# Altium footprint library PCB_TechDemo.PcbLib: 44 footprints (part 2 of 3)
Each footprint in its own frame and in the unit in brackets; x right, y up, seen from the top. Pads: shape width x height; smd on the part's side, far side on the other; paste and mask are expansions set on the pad; w line width, h text height; cw(c..) or ccw(c..) is an arc to the next point about the centre after c.
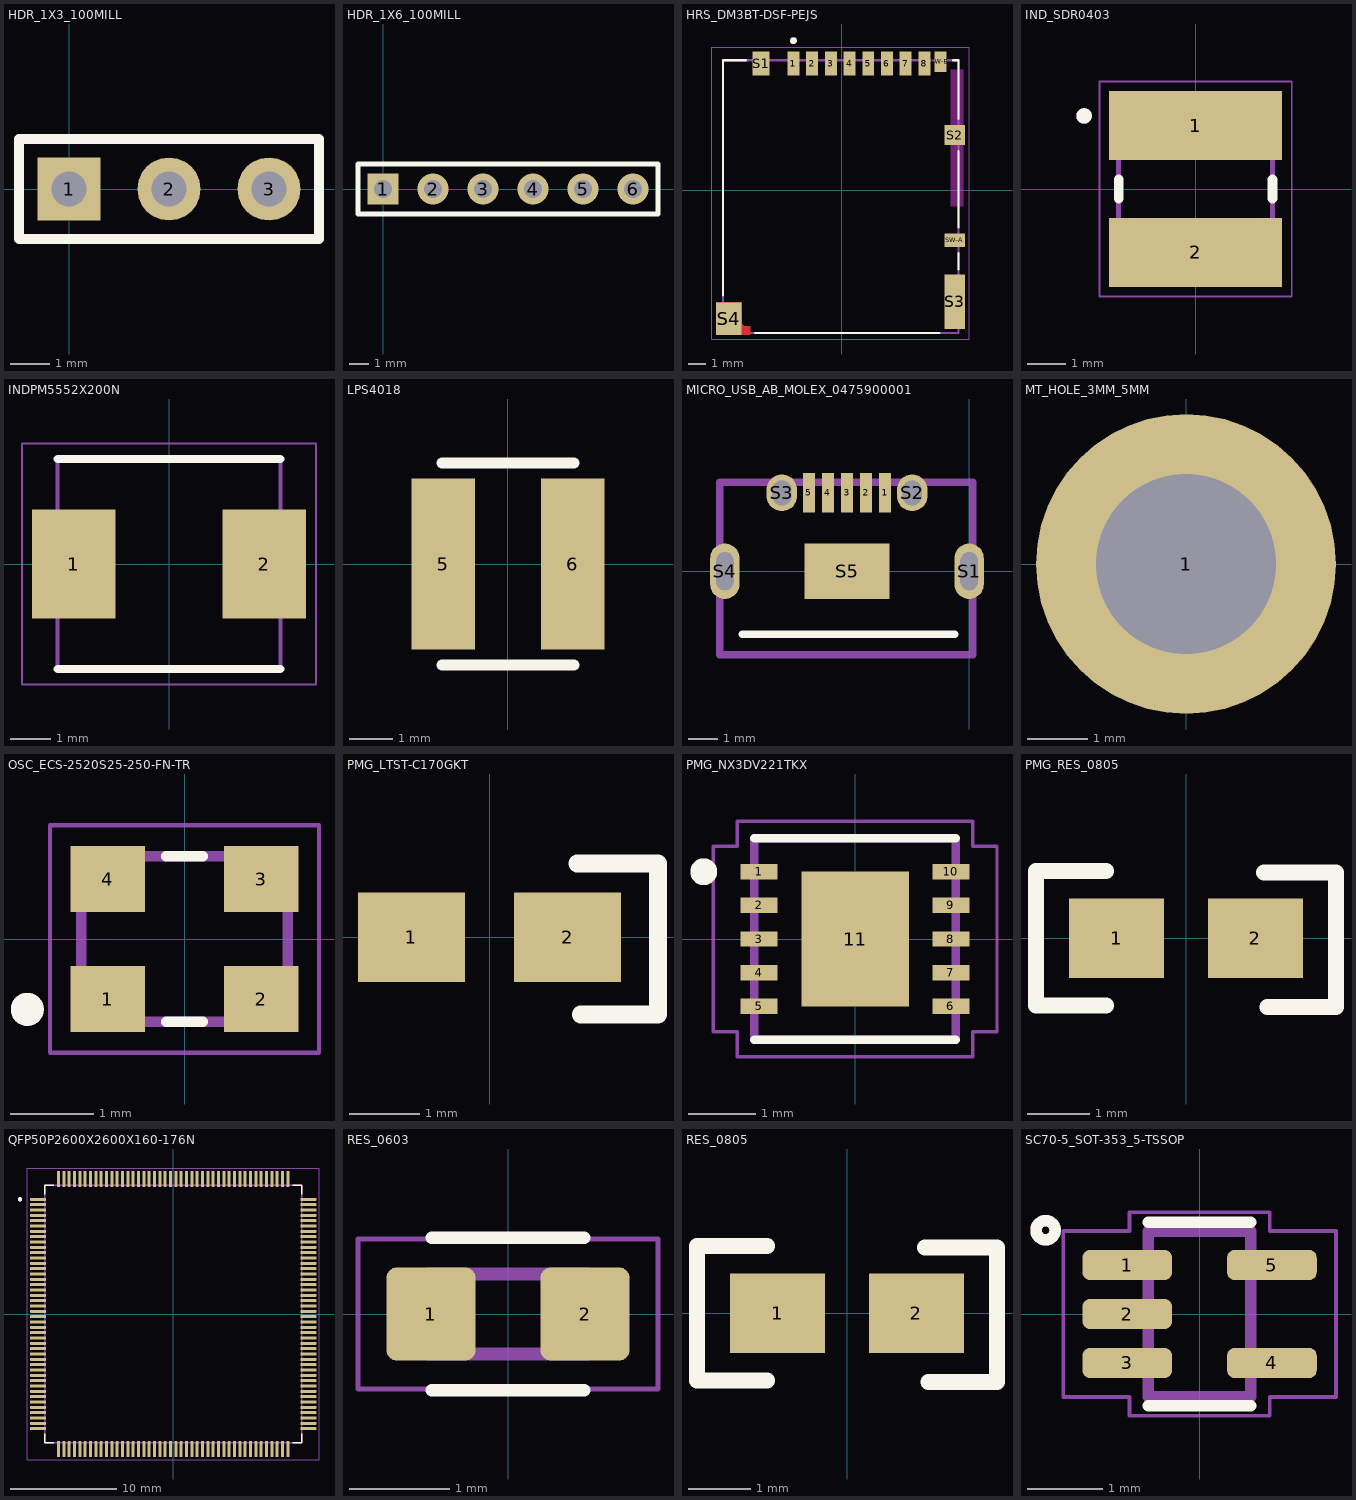
[diagram p1: the footprints below, top view; thin cyan lines are the x and y axes]

## HDR_1X3_100MILL [mm] "SINGLE ROW 3 PIN HDR 2.54MM"
height 10.16
pads (3):
  rect 1.6x1.6 hole 0.9: 1(0,0)
  round 1.6 hole 0.9: 2(2.54,0) 3(5.08,0)
Top Overlay:
  lines w0.254: -1.27,-1.27 6.35,-1.27 6.35,1.27 -1.27,1.27 -1.27,-1.27
3D body: height 8.57, standoff -2.97, extent -1.27,-1.27 6.35,1.27

## HDR_1X6_100MILL [mm] "SINGLE ROW 6 PIN HDR 2.54MM"
pads (6):
  rect 1.6x1.6 hole 0.9: 1(0,0)
  round 1.6 hole 0.9: 2(2.54,0) 3(5.08,0) 4(7.62,0) 5(10.16,0) 6(12.7,0)
Top Overlay:
  lines w0.254: -1.27,-1.27 13.97,-1.27 13.97,1.27 -1.27,1.27 -1.27,-1.27
3D body: height 8.57, standoff -2.97, extent -1.32,-1.17 13.92,1.37

## HRS_DM3BT-DSF-PEJS [mm] "HIROSE_DM3BT-DSF-PEJS"
height 3
pads (14):
  rect 0.7x1.4 smd: 1(-2.85,7.45) 2(-1.75,7.45) 3(-0.65,7.45) 4(0.45,7.45) 5(1.55,7.45) 6(2.65,7.45) 7(3.75,7.45) 8(4.85,7.45)
  rect 1x1.4 smd: S1(-4.75,7.45)
  rect 1.2x1.2 smd: S2(6.65,3.25)
  rect 1.2x3.2 smd: S3(6.65,-6.55)
  rect 1.5x1.9 smd paste-2 mask+0: S4(-6.65,-7.55)
  rect 1.2x0.8 smd: SW-A(6.65,-2.95)
  rect 0.7x1.2 smd: SW-B(5.8,7.55)
Top Layer:
  region: -5.9,-7.85 -5.75,-8 -5.4,-8 -5.4,-8.5 -7.4,-8.5 -7.4,-6.6 -5.9,-6.6
Top Overlay:
  circle w0.2: c-2.85,8.8 r0.1
  lines w0.127: -7,-6.2 -7,7.65 -5.65,7.65 ; -5.1,-8.4 5.75,-8.4 ; 6.55,7.65 6.85,7.65 6.85,4.2 ; 6.85,-4.65 6.85,-3.7 ; 6.85,-2.2 6.85,2.3
Top Paste:
  region: -5.9,-7.85 -5.75,-8 -5.4,-8 -5.4,-8.5 -7.4,-8.5 -7.4,-6.6 -5.9,-6.6
Top Solder:
  region: -5.8,-7.75 -5.65,-7.9 -5.3,-7.9 -5.3,-8.6 -7.5,-8.6 -7.5,-6.5 -5.8,-6.5
Keep-Out Layer:
  region: 7.15,-0.95 6.4,-0.95 6.4,2.65 7.15,2.65
  region: 7.15,3.85 6.4,3.85 6.4,7.1 7.15,7.1
  region: 7.15,-0.95 6.4,-0.95 6.4,2.65 7.15,2.65
  region: 7.15,3.85 6.4,3.85 6.4,7.1 7.15,7.1
Mechanical 13:
  circle w0.2: c-2.85,8.8 r0.1
  lines w0.127: -7,-8.4 -7,7.65 6.85,7.65 6.85,-8.4 -7,-8.4
Mechanical 15:
  lines w0.05: -7.65,-8.75 -7.65,8.4 7.5,8.4 7.5,-8.75 -7.65,-8.75
3D body: height 1.85, standoff 0.02, extent -7,-9.875 6.85,7.675

## IND_SDR0403 [mm] "INDUCTOR BOURNS SDR0403 SERIES"
height 3.5
pads (2):
  rect 4.5x1.8 smd: 1(0,1.65) 2(0,-1.65)
Top Overlay:
  circle w0.2: c-2.9,1.9 r0.1
  lines w0.254: -2,-0.25 -2,0.25 ; 2,-0.25 2,0.25
Mechanical 13:
  circle w0.2: c-2.9,1.9 r0.1
  lines w0.127: -2,-0.75 ccw(c0,-0.361) 2,-0.75 2,0.75 ccw(c0,0.361) -2,0.75 -2,-0.75
Mechanical 15:
  lines w0.05: -2.5,-2.8 -2.5,2.8 2.5,2.8 2.5,-2.8 -2.5,-2.8
3D body: height 3.25, standoff 0, extent -2.25,-2.201 2.25,2.201

## INDPM5552X200N [mm] "VISHAY IHLP-2020BZ-01"
height 2
pads (2):
  rect 2.05x2.7 smd: 1(-2.35,0) 2(2.35,0)
Top Overlay:
  lines w0.2: -2.745,-2.59 2.745,-2.59 ; -2.745,2.59 2.745,2.59
Mechanical 13:
  lines w0.05: -3.625,-2.967 -3.625,2.967 3.625,2.967 3.625,-2.967 -3.625,-2.967
  lines w0.1: -2.745,-2.59 -2.745,2.59 2.745,2.59 2.745,-2.59 -2.745,-2.59
3D body: height 2.05, standoff 0.13, extent -2.725,-2.546 2.725,2.6

## LPS4018 [mm] "COIL CRAFT LPS4018 INDUCTOR SERIES"
height 1.8
pads (2):
  rect 1.45x3.89 smd: 5(-1.475,0) 6(1.475,0)
Top Overlay:
  lines w0.254: -1.5,-2.3 1.5,-2.3 ; -1.5,2.3 1.5,2.3
3D body: height 1.8, standoff 0, extent -1.99,-1.99 1.99,1.99

## MICRO_USB_AB_MOLEX_0475900001 [mm] "MICRO USB AB MOLEX 0475900001"
height 0.6
pads (10):
  rect 0.4x1.35 smd: 1(-2.875,2.675) 2(-3.525,2.675) 3(-4.175,2.675) 4(-4.825,2.675) 5(-5.475,2.675)
  oval 1x1.9 hole 0.6 slot 1.3 at 90 deg: S1(0,0) S4(-8.35,0)
  oval 1.05x1.25 hole 0.65 slot 0.85 at 90 deg: S2(-1.95,2.675) S3(-6.4,2.675)
  rect 2.9x1.9 smd: S5(-4.175,0)
Top Overlay:
  lines w0.254: -7.75,-2.15 -0.5,-2.15
Mechanical 15:
  lines w0.254: -8.525,-2.859 0.125,-2.859 0.125,3.034 -8.525,3.034 -8.525,-2.859
3D body: height 2.76, standoff -0.55, extent -8.5,-2.947 0.15,2.947

## MT_HOLE_3MM_5MM [mm] "3MM ID / 5MM OD"
pads (1):
  round 5 hole 3: 1(0,0)

## OSC_ECS-2520S25-250-FN-TR [mm]
pads (4):
  rect 0.9x0.8 smd: 1(-0.925,-0.725) 2(0.925,-0.725) 3(0.925,0.725) 4(-0.925,0.725)
Top Overlay:
  circle w0.2: c-1.9,-0.85 r0.1
  lines w0.127: -0.221,-1 0.221,-1 ; -0.221,1 0.221,1
Mechanical 13:
  circle w0.2: c-1.9,-0.85 r0.1
  lines w0.127: -1.25,-1 -1.25,1 1.25,1 1.25,-1 -1.25,-1
Mechanical 15:
  lines w0.05: -1.625,-1.375 -1.625,1.375 1.625,1.375 1.625,-1.375 -1.625,-1.375
3D body: height 0.82, standoff 0, extent -1.6,-1.25 1.6,1.25

## PMG_LTST-C170GKT [mil] "LTST-C170GKT"
height 43.31
pads (2):
  rect 60x50 smd: 1(-43.78,0) 2(43.78,0)
Top Overlay:
  lines w10: 49.21,41.34 94.49,41.34 94.49,-43.31 51.18,-43.31
3D body: height 43.31, standoff -0.39, extent -39.37,-24.6 39.37,24.61

## PMG_NX3DV221TKX [mm] "SWDAT_IC USB 2.0 SWITCH HS 10HVSON"
pads (11):
  rect 0.55x0.23 smd: 1(-1.425,1) 2(-1.425,0.5) 3(-1.425,0) 4(-1.425,-0.5) 5(-1.425,-1) 6(1.425,-1) 7(1.425,-0.5) 8(1.425,0) 9(1.425,0.5) 10(1.425,1)
  rect 1.6x2 smd paste-2: 11(0,0)
Top Overlay:
  circle w0.2: c-2.25,1 r0.1
  lines w0.127: -1.5,-1.5 1.5,-1.5 ; -1.5,1.5 1.5,1.5
Top Paste:
  region: 0.506,-0.635 -0.506,-0.635 -0.506,0.634 0.506,0.634
Mechanical 13:
  lines w0.127: -1.5,-1.5 -1.5,1.5 1.5,1.5 1.5,-1.5 -1.5,-1.5
Mechanical 15:
  lines w0.05: -2.11,-1.38 -2.11,1.38 -1.75,1.38 -1.75,1.75 1.75,1.75 1.75,1.38 2.11,1.38 2.11,-1.38 1.75,-1.38 1.75,-1.75 -1.75,-1.75 -1.75,-1.38 -2.11,-1.38
3D body: height 1, standoff 0, extent -1.5,-1.5 1.5,1.5

## PMG_RES_0805 [mil] "RES 0805"
pads (2):
  rect 60x50 smd: 1(-43.78,0) 2(43.78,0)
Top Overlay:
  lines w10: -50.2,-42.32 -94.49,-42.32 ; -50.2,42.32 -94.49,42.32 ; 49.21,41.34 94.49,41.34 94.49,-43.31 51.18,-43.31 ; -94.49,-42.32 -94.49,-42.32 ; -94.49,-42.32 -94.49,42.32 ; -94.49,42.32 -94.49,42.32
3D body: height 29.92, standoff 0, extent -45.27,-26.57 45.28,26.58
3D body: height 43.31, standoff 0, extent -39.37,118.11 -39.37,118.11

## QFP50P2600X2600X160-176N [mm]
pads (176):
  rrect25% 1.49x0.28 smd: 1(-12.67,10.75) 2(-12.67,10.25) 3(-12.67,9.75) 4(-12.67,9.25) 5(-12.67,8.75) 6(-12.67,8.25) 7(-12.67,7.75) 8(-12.67,7.25) 9(-12.67,6.75) 10(-12.67,6.25) 11(-12.67,5.75) 12(-12.67,5.25) 13(-12.67,4.75) 14(-12.67,4.25) 15(-12.67,3.75) 16(-12.67,3.25) 17(-12.67,2.75) 18(-12.67,2.25) 19(-12.67,1.75) 20(-12.67,1.25) 21(-12.67,0.75) 22(-12.67,0.25) 23(-12.67,-0.25) 24(-12.67,-0.75) 25(-12.67,-1.25) 26(-12.67,-1.75) 27(-12.67,-2.25) 28(-12.67,-2.75) 29(-12.67,-3.25) 30(-12.67,-3.75) 31(-12.67,-4.25) 32(-12.67,-4.75) 33(-12.67,-5.25) 34(-12.67,-5.75) 35(-12.67,-6.25) 36(-12.67,-6.75) 37(-12.67,-7.25) 38(-12.67,-7.75) 39(-12.67,-8.25) 40(-12.67,-8.75) 41(-12.67,-9.25) 42(-12.67,-9.75) 43(-12.67,-10.25) 44(-12.67,-10.75) 89(12.67,-10.75) 90(12.67,-10.25) 91(12.67,-9.75) 92(12.67,-9.25) 93(12.67,-8.75) 94(12.67,-8.25) 95(12.67,-7.75) 96(12.67,-7.25) 97(12.67,-6.75) 98(12.67,-6.25) 99(12.67,-5.75) 100(12.67,-5.25) 101(12.67,-4.75) 102(12.67,-4.25) 103(12.67,-3.75) 104(12.67,-3.25) 105(12.67,-2.75) 106(12.67,-2.25) 107(12.67,-1.75) 108(12.67,-1.25) 109(12.67,-0.75) 110(12.67,-0.25) 111(12.67,0.25) 112(12.67,0.75) 113(12.67,1.25) 114(12.67,1.75) 115(12.67,2.25) 116(12.67,2.75) 117(12.67,3.25) 118(12.67,3.75) 119(12.67,4.25) 120(12.67,4.75) 121(12.67,5.25) 122(12.67,5.75) 123(12.67,6.25) 124(12.67,6.75) 125(12.67,7.25) 126(12.67,7.75) 127(12.67,8.25) 128(12.67,8.75) 129(12.67,9.25) 130(12.67,9.75) 131(12.67,10.25) 132(12.67,10.75)
  rrect25% 0.28x1.49 smd: 45(-10.75,-12.67) 46(-10.25,-12.67) 47(-9.75,-12.67) 48(-9.25,-12.67) 49(-8.75,-12.67) 50(-8.25,-12.67) 51(-7.75,-12.67) 52(-7.25,-12.67) 53(-6.75,-12.67) 54(-6.25,-12.67) 55(-5.75,-12.67) 56(-5.25,-12.67) 57(-4.75,-12.67) 58(-4.25,-12.67) 59(-3.75,-12.67) 60(-3.25,-12.67) 61(-2.75,-12.67) 62(-2.25,-12.67) 63(-1.75,-12.67) 64(-1.25,-12.67) 65(-0.75,-12.67) 66(-0.25,-12.67) 67(0.25,-12.67) 68(0.75,-12.67) 69(1.25,-12.67) 70(1.75,-12.67) 71(2.25,-12.67) 72(2.75,-12.67) 73(3.25,-12.67) 74(3.75,-12.67) 75(4.25,-12.67) 76(4.75,-12.67) 77(5.25,-12.67) 78(5.75,-12.67) 79(6.25,-12.67) 80(6.75,-12.67) 81(7.25,-12.67) 82(7.75,-12.67) 83(8.25,-12.67) 84(8.75,-12.67) 85(9.25,-12.67) 86(9.75,-12.67) 87(10.25,-12.67) 88(10.75,-12.67) 133(10.75,12.67) 134(10.25,12.67) 135(9.75,12.67) 136(9.25,12.67) 137(8.75,12.67) 138(8.25,12.67) 139(7.75,12.67) 140(7.25,12.67) 141(6.75,12.67) 142(6.25,12.67) 143(5.75,12.67) 144(5.25,12.67) 145(4.75,12.67) 146(4.25,12.67) 147(3.75,12.67) 148(3.25,12.67) 149(2.75,12.67) 150(2.25,12.67) 151(1.75,12.67) 152(1.25,12.67) 153(0.75,12.67) 154(0.25,12.67) 155(-0.25,12.67) 156(-0.75,12.67) 157(-1.25,12.67) 158(-1.75,12.67) 159(-2.25,12.67) 160(-2.75,12.67) 161(-3.25,12.67) 162(-3.75,12.67) 163(-4.25,12.67) 164(-4.75,12.67) 165(-5.25,12.67) 166(-5.75,12.67) 167(-6.25,12.67) 168(-6.75,12.67) 169(-7.25,12.67) 170(-7.75,12.67) 171(-8.25,12.67) 172(-8.75,12.67) 173(-9.25,12.67) 174(-9.75,12.67) 175(-10.25,12.67) 176(-10.75,12.67)
Top Overlay:
  circle w0.2: c-14.36,10.75 r0.1
  lines w0.127: -12.05,-11.21 -12.05,-12.05 -11.21,-12.05 ; -12.05,11.21 -12.05,12.05 -11.21,12.05 ; 11.21,-12.05 12.05,-12.05 12.05,-11.21 ; 11.21,12.05 12.05,12.05 12.05,11.21
Mechanical 13:
  circle w0.2: c-14.36,10.75 r0.1
  lines w0.127: -12.05,-12.05 -12.05,12.05 12.05,12.05 12.05,-12.05 -12.05,-12.05
Mechanical 15:
  lines w0.05: -13.665,-13.665 -13.665,13.665 13.665,13.665 13.665,-13.665 -13.665,-13.665
3D body: height 1.55, standoff -0.02, extent -12.886,-12.886 12.886,12.886

## RES_0603 [mm] "RES 0603 .125W"
height 0.9
pads (2):
  rrect22% 0.89x0.93 smd: 1(-0.77,0) 2(0.77,0)
Top Overlay:
  lines w0.127: -0.762,-0.762 0.762,-0.762 ; -0.762,0.762 0.762,0.762
Mechanical 13:
  lines w0.127: -0.8,-0.4 0.8,-0.4 0.8,0.4 -0.8,0.4 -0.8,-0.4
Mechanical 15:
  lines w0.05: -1.5,-0.75 1.5,-0.75 1.5,0.75 -1.5,0.75 -1.5,-0.75
3D body: height 0.53, standoff 0.02, extent -0.8,-0.43 0.8,0.43

## RES_0805 [mil]
pads (2):
  rect 60x50 smd: 1(-43.78,0) 2(43.78,0)
Top Overlay:
  lines w10: -50.2,-42.32 -94.49,-42.32 ; -50.2,42.32 -94.49,42.32 ; 49.21,41.34 94.49,41.34 94.49,-43.31 51.18,-43.31 ; -94.49,-42.32 -94.49,-42.32 ; -94.49,-42.32 -94.49,42.32 ; -94.49,42.32 -94.49,42.32
3D body: height 29.92, standoff 0, extent -45.27,-26.57 45.28,26.58
3D body: height 43.31, standoff 0, extent -39.37,118.11 -39.37,118.11

## SC70-5_SOT-353_5-TSSOP [mm] "COMMON NAMES: SC70-5, SOT-353, 5-TSSOP"
height 1.2
pads (5):
  rrect50% 1.19x0.4 smd: 1(-0.96,0.65) 2(-0.96,0) 3(-0.96,-0.65) 4(0.96,-0.65) 5(0.96,0.65)
Top Overlay:
  lines w0.152: -0.68,-1.219 0.68,-1.219 ; -0.68,1.219 0.68,1.219 ; -2.044,0.985 ccw(c-2.044,1.112) -2.044,1.239 ccw(c-2.044,1.112) -2.044,0.985
Mechanical 13:
  lines w0.152: -2.044,0.985 cw(c-2.044,1.112) -2.044,1.239 cw(c-2.044,1.112) -2.044,0.985 ; -0.68,-1.1 0.68,-1.1 0.68,1.1 -0.68,1.1 -0.68,-1.1
Mechanical 15:
  lines w0.05: -1.81,-1.1 -1.81,1.1 -0.93,1.1 -0.93,1.35 0.93,1.35 0.93,1.1 1.81,1.1 1.81,-1.1 0.93,-1.1 0.93,-1.35 -0.93,-1.35 -0.93,-1.1 -1.81,-1.1
3D body: height 0.98, standoff 0.01, extent -1.1,-1 1.1,1